# Altium integrated library Weidmueller_OMNIMATE_Power.IntLib: 508 symbols (part 5 of 9) (continued)
## 1157350000 (continued)
OMNIMATE Power - series BU/SU 10.16IT; PartNumber: 1157350000; Manufacturer: Weidmueller; Short_text_for_material: SU 10.16IT/04/270MF4 3.5AG BK BX; Side_termination_characteristic: closed side; Note: Middle flange; Mounting_onto_the_PCB: Solder connection; Pitch_mm: 10.16 mm; Pitch_inch: 0.4 inch; No_of_poles: 4; Outgoing_elbow: 270°; Solder_pin_length_mm: 3.5 mm; Contact_material: Cu-Leg; Contact_surface: silver-plated; Insulating_material: PA GF; UL_94_flammability_rating: V-0; Rated_voltage_for_surge_voltage_class_pollution_degree_II_2: 1000 V; Rated_voltage_use_group_B_UL_1059: 300 V; Rated_current_use_group_B_UL_1059: 54 A; PackageReference: SU_10_16IT_270MF4_04; Colour: Black; Packaging: Box; Qty: 36 PCS; Revision: V1; ComponentLink1Description: Manufacturer URL; ComponentLink1URL: http://www.weidmueller.com/; ComponentLink2Description: URL Link1; ComponentLink2URL: http://catalog.weidmueller.com/catalog/Start.do?localeId=en&ObjectID=1157350000
footprint SU_10_16IT_270MF4_04 (OMNIMATE Power - Serie BU/SU 10.16IT  SU 10.16IT/04/270MF4 3.5)
pins: A1, A2, A3, A4

## 1157350000_Single
designator J?
OMNIMATE Power - series BU/SU 10.16IT; PartNumber: 1157350000; Manufacturer: Weidmueller; Short_text_for_material: SU 10.16IT/04/270MF4 3.5AG BK BX; Side_termination_characteristic: closed side; Note: Middle flange; Mounting_onto_the_PCB: Solder connection; Pitch_mm: 10.16 mm; Pitch_inch: 0.4 inch; No_of_poles: 4; Outgoing_elbow: 270°; Solder_pin_length_mm: 3.5 mm; Contact_material: Cu-Leg; Contact_surface: silver-plated; Insulating_material: PA GF; UL_94_flammability_rating: V-0; Rated_voltage_for_surge_voltage_class_pollution_degree_II_2: 1000 V; Rated_voltage_use_group_B_UL_1059: 300 V; Rated_current_use_group_B_UL_1059: 54 A; PackageReference: SU_10_16IT_270MF4_04; Colour: Black; Packaging: Box; Qty: 36 PCS; Revision: V1; ComponentLink1Description: Manufacturer URL; ComponentLink1URL: http://www.weidmueller.com/; ComponentLink2Description: URL Link1; ComponentLink2URL: http://catalog.weidmueller.com/catalog/Start.do?localeId=en&ObjectID=1157350000
footprint SU_10_16IT_270MF4_04 (OMNIMATE Power - Serie BU/SU 10.16IT  SU 10.16IT/04/270MF4 3.5)
part A pins: A1
part B pins: A2
part C pins: A3
part D pins: A4

## 1157380000
designator J?
OMNIMATE Power - series BV/SV 7.62HP; PartNumber: 1157380000; Manufacturer: Weidmueller; Short_text_for_material: SV 7.62HP/04/90G SC/08R SN BK BX; Side_termination_characteristic: closed side; Mounting_onto_the_PCB: Solder connection; Pitch_mm: 7.62 mm; Pitch_inch: 0.3 inch; No_of_poles: 4; Outgoing_elbow: 90°; Solder_pin_length_mm: 3.5 mm; Contact_material: Cu-Leg; Contact_surface: tinned; Insulating_material: PA GF; UL_94_flammability_rating: V-0; Rated_voltage_for_surge_voltage_class_pollution_degree_II_2: 1000 V; Rated_voltage_use_group_B_UL_1059: 300 V; Rated_current_use_group_B_UL_1059: 35 A; PackageReference: SV_7_62HP_04_SC_3_81_90_08; Colour: Black; Packaging: Box; Qty: 42 PCS; Revision: V1; ComponentLink1Description: Manufacturer URL; ComponentLink1URL: http://www.weidmueller.com/; ComponentLink2Description: URL Link1; ComponentLink2URL: http://catalog.weidmueller.com/catalog/Start.do?localeId=en&ObjectID=1157380000
footprint SV_7_62HP_04_SC_3_81_90_08 (OMNIMATE Power - Serie BV/SV 7.62HP  SV 7.62HP/04/90G SC/08R)
part A pins: P1, P2, P3, P4
part B pins: SA1, SA2, SA3, SA4
part C pins: SB1, SB2, SB3, SB4

## 1157380000_Single
designator J?
OMNIMATE Power - series BV/SV 7.62HP; PartNumber: 1157380000; Manufacturer: Weidmueller; Short_text_for_material: SV 7.62HP/04/90G SC/08R SN BK BX; Side_termination_characteristic: closed side; Mounting_onto_the_PCB: Solder connection; Pitch_mm: 7.62 mm; Pitch_inch: 0.3 inch; No_of_poles: 4; Outgoing_elbow: 90°; Solder_pin_length_mm: 3.5 mm; Contact_material: Cu-Leg; Contact_surface: tinned; Insulating_material: PA GF; UL_94_flammability_rating: V-0; Rated_voltage_for_surge_voltage_class_pollution_degree_II_2: 1000 V; Rated_voltage_use_group_B_UL_1059: 300 V; Rated_current_use_group_B_UL_1059: 35 A; PackageReference: SV_7_62HP_04_SC_3_81_90_08; Colour: Black; Packaging: Box; Qty: 42 PCS; Revision: V1; ComponentLink1Description: Manufacturer URL; ComponentLink1URL: http://www.weidmueller.com/; ComponentLink2Description: URL Link1; ComponentLink2URL: http://catalog.weidmueller.com/catalog/Start.do?localeId=en&ObjectID=1157380000
footprint SV_7_62HP_04_SC_3_81_90_08 (OMNIMATE Power - Serie BV/SV 7.62HP  SV 7.62HP/04/90G SC/08R)
part A pins: P1
part B pins: P2
part C pins: P3
part D pins: P4
part E pins: SA1
part F pins: SA2
part G pins: SA3
part H pins: SA4
part I pins: SB1
part J pins: SB2
part K pins: SB3
part L pins: SB4

## 1173610000
designator J?
OMNIMATE Power - series BL/SL 7.62IT; PartNumber: 1173610000; Manufacturer: Weidmueller; Short_text_for_material: SL 7.62IT/02/90MF2 3.2SN BK BX SO; Side_termination_characteristic: closed side; Note: Middle flange; Mounting_onto_the_PCB: Solder connection; Pitch_mm: 7.62 mm; Pitch_inch: 0.3 inch; No_of_poles: 2; Outgoing_elbow: 90°; Solder_pin_length_mm: 3.2 mm; Contact_material: Cu-Leg; Contact_surface: tinned; Insulating_material: PBT GF; UL_94_flammability_rating: V-0; Rated_voltage_for_surge_voltage_class_pollution_degree_II_2: 630 V; Rated_voltage_use_group_B_UL_1059: 300 V; Rated_current_use_group_B_UL_1059: 20 A; PackageReference: SL_7_62IT_90MF2_02; Colour: Black; Packaging: Box; Qty: 100 PCS; Revision: V1; ComponentLink1Description: Manufacturer URL; ComponentLink1URL: http://www.weidmueller.com/; ComponentLink2Description: URL Link1; ComponentLink2URL: http://catalog.weidmueller.com/catalog/Start.do?localeId=en&ObjectID=1173610000
footprint SL_7_62IT_90MF2_02 (OMNIMATE Power - Serie BL/SL 7.62IT  SL 7.62IT/02/90MF2 3.2)
pins: A1, A2

## 1173610000_Single
designator J?
OMNIMATE Power - series BL/SL 7.62IT; PartNumber: 1173610000; Manufacturer: Weidmueller; Short_text_for_material: SL 7.62IT/02/90MF2 3.2SN BK BX SO; Side_termination_characteristic: closed side; Note: Middle flange; Mounting_onto_the_PCB: Solder connection; Pitch_mm: 7.62 mm; Pitch_inch: 0.3 inch; No_of_poles: 2; Outgoing_elbow: 90°; Solder_pin_length_mm: 3.2 mm; Contact_material: Cu-Leg; Contact_surface: tinned; Insulating_material: PBT GF; UL_94_flammability_rating: V-0; Rated_voltage_for_surge_voltage_class_pollution_degree_II_2: 630 V; Rated_voltage_use_group_B_UL_1059: 300 V; Rated_current_use_group_B_UL_1059: 20 A; PackageReference: SL_7_62IT_90MF2_02; Colour: Black; Packaging: Box; Qty: 100 PCS; Revision: V1; ComponentLink1Description: Manufacturer URL; ComponentLink1URL: http://www.weidmueller.com/; ComponentLink2Description: URL Link1; ComponentLink2URL: http://catalog.weidmueller.com/catalog/Start.do?localeId=en&ObjectID=1173610000
footprint SL_7_62IT_90MF2_02 (OMNIMATE Power - Serie BL/SL 7.62IT  SL 7.62IT/02/90MF2 3.2)
part A pins: A1
part B pins: A2

## 1173640000
designator J?
OMNIMATE Power - series BL/SL 7.62IT; PartNumber: 1173640000; Manufacturer: Weidmueller; Short_text_for_material: SL 7.62IT/03/90MF2 3.2SN BK BX; Side_termination_characteristic: closed side; Note: Middle flange; Mounting_onto_the_PCB: Solder connection; Pitch_mm: 7.62 mm; Pitch_inch: 0.3 inch; No_of_poles: 3; Outgoing_elbow: 90°; Solder_pin_length_mm: 3.2 mm; Contact_material: Cu-Leg; Contact_surface: tinned; Insulating_material: PBT GF; UL_94_flammability_rating: V-0; Rated_voltage_for_surge_voltage_class_pollution_degree_II_2: 630 V; Rated_voltage_use_group_B_UL_1059: 300 V; Rated_current_use_group_B_UL_1059: 20 A; PackageReference: SL_7_62IT_90MF2_03; Colour: Black; Packaging: Box; Qty: 100 PCS; Revision: V1; ComponentLink1Description: Manufacturer URL; ComponentLink1URL: http://www.weidmueller.com/; ComponentLink2Description: URL Link1; ComponentLink2URL: http://catalog.weidmueller.com/catalog/Start.do?localeId=en&ObjectID=1173640000
footprint SL_7_62IT_90MF2_03 (OMNIMATE Power - Serie BL/SL 7.62IT  SL 7.62IT/02/90MF3 3.2)
pins: A1, A2, A3

## 1173640000_Single
designator J?
OMNIMATE Power - series BL/SL 7.62IT; PartNumber: 1173640000; Manufacturer: Weidmueller; Short_text_for_material: SL 7.62IT/03/90MF2 3.2SN BK BX; Side_termination_characteristic: closed side; Note: Middle flange; Mounting_onto_the_PCB: Solder connection; Pitch_mm: 7.62 mm; Pitch_inch: 0.3 inch; No_of_poles: 3; Outgoing_elbow: 90°; Solder_pin_length_mm: 3.2 mm; Contact_material: Cu-Leg; Contact_surface: tinned; Insulating_material: PBT GF; UL_94_flammability_rating: V-0; Rated_voltage_for_surge_voltage_class_pollution_degree_II_2: 630 V; Rated_voltage_use_group_B_UL_1059: 300 V; Rated_current_use_group_B_UL_1059: 20 A; PackageReference: SL_7_62IT_90MF2_03; Colour: Black; Packaging: Box; Qty: 100 PCS; Revision: V1; ComponentLink1Description: Manufacturer URL; ComponentLink1URL: http://www.weidmueller.com/; ComponentLink2Description: URL Link1; ComponentLink2URL: http://catalog.weidmueller.com/catalog/Start.do?localeId=en&ObjectID=1173640000
footprint SL_7_62IT_90MF2_03 (OMNIMATE Power - Serie BL/SL 7.62IT  SL 7.62IT/02/90MF3 3.2)
part A pins: A1
part B pins: A2
part C pins: A3

## 1173690000
designator J?
OMNIMATE Power - series BL/SL 7.62IT; PartNumber: 1173690000; Manufacturer: Weidmueller; Short_text_for_material: SL 7.62IT/03/90MF3 3.2SN BK BX; Side_termination_characteristic: closed side; Note: Middle flange; Mounting_onto_the_PCB: Solder connection; Pitch_mm: 7.62 mm; Pitch_inch: 0.3 inch; No_of_poles: 3; Outgoing_elbow: 90°; Solder_pin_length_mm: 3.2 mm; Contact_material: Cu-Leg; Contact_surface: tinned; Insulating_material: PBT GF; UL_94_flammability_rating: V-0; Rated_voltage_for_surge_voltage_class_pollution_degree_II_2: 630 V; Rated_voltage_use_group_B_UL_1059: 300 V; Rated_current_use_group_B_UL_1059: 20 A; PackageReference: SL_7_62IT_90MF3_03; Colour: Black; Packaging: Box; Qty: 100 PCS; Revision: V1; ComponentLink1Description: Manufacturer URL; ComponentLink1URL: http://www.weidmueller.com/; ComponentLink2Description: URL Link1; ComponentLink2URL: http://catalog.weidmueller.com/catalog/Start.do?localeId=en&ObjectID=1173690000
footprint SL_7_62IT_90MF3_03 (OMNIMATE Power - Serie BL/SL 7.62IT  SL 7.62IT/03/90MF3 3.2)
pins: A1, A2, A3

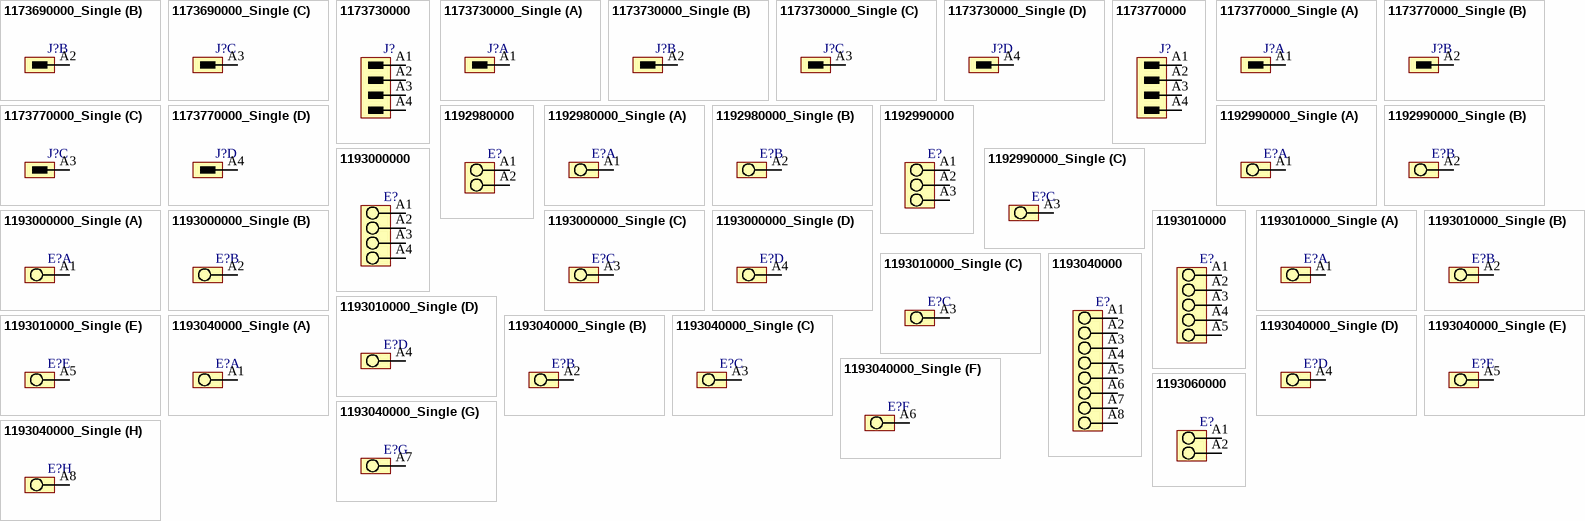
[diagram p18: symbols 1173690000_Single to 1193060000]

## 1173690000_Single
designator J?
OMNIMATE Power - series BL/SL 7.62IT; PartNumber: 1173690000; Manufacturer: Weidmueller; Short_text_for_material: SL 7.62IT/03/90MF3 3.2SN BK BX; Side_termination_characteristic: closed side; Note: Middle flange; Mounting_onto_the_PCB: Solder connection; Pitch_mm: 7.62 mm; Pitch_inch: 0.3 inch; No_of_poles: 3; Outgoing_elbow: 90°; Solder_pin_length_mm: 3.2 mm; Contact_material: Cu-Leg; Contact_surface: tinned; Insulating_material: PBT GF; UL_94_flammability_rating: V-0; Rated_voltage_for_surge_voltage_class_pollution_degree_II_2: 630 V; Rated_voltage_use_group_B_UL_1059: 300 V; Rated_current_use_group_B_UL_1059: 20 A; PackageReference: SL_7_62IT_90MF3_03; Colour: Black; Packaging: Box; Qty: 100 PCS; Revision: V1; ComponentLink1Description: Manufacturer URL; ComponentLink1URL: http://www.weidmueller.com/; ComponentLink2Description: URL Link1; ComponentLink2URL: http://catalog.weidmueller.com/catalog/Start.do?localeId=en&ObjectID=1173690000
footprint SL_7_62IT_90MF3_03 (OMNIMATE Power - Serie BL/SL 7.62IT  SL 7.62IT/03/90MF3 3.2)
part A pins: A1
part B pins: A2
part C pins: A3

## 1173730000
designator J?
OMNIMATE Power - series BL/SL 7.62IT; PartNumber: 1173730000; Manufacturer: Weidmueller; Short_text_for_material: SL 7.62IT/04/90MF2 3.2SN BK BX; Side_termination_characteristic: closed side; Note: Middle flange; Mounting_onto_the_PCB: Solder connection; Pitch_mm: 7.62 mm; Pitch_inch: 0.3 inch; No_of_poles: 4; Outgoing_elbow: 90°; Solder_pin_length_mm: 3.2 mm; Contact_material: Cu-Leg; Contact_surface: tinned; Insulating_material: PBT GF; UL_94_flammability_rating: V-0; Rated_voltage_for_surge_voltage_class_pollution_degree_II_2: 630 V; Rated_voltage_use_group_B_UL_1059: 300 V; Rated_current_use_group_B_UL_1059: 20 A; PackageReference: SL_7_62IT_90MF2_04; Colour: Black; Packaging: Box; Qty: 100 PCS; Revision: V1; ComponentLink1Description: Manufacturer URL; ComponentLink1URL: http://www.weidmueller.com/; ComponentLink2Description: URL Link1; ComponentLink2URL: http://catalog.weidmueller.com/catalog/Start.do?localeId=en&ObjectID=1173730000
footprint SL_7_62IT_90MF2_04 (OMNIMATE Power - Serie BL/SL 7.62IT  SL 7.62IT/02/90MF4 3.2)
pins: A1, A2, A3, A4

## 1173730000_Single
designator J?
OMNIMATE Power - series BL/SL 7.62IT; PartNumber: 1173730000; Manufacturer: Weidmueller; Short_text_for_material: SL 7.62IT/04/90MF2 3.2SN BK BX; Side_termination_characteristic: closed side; Note: Middle flange; Mounting_onto_the_PCB: Solder connection; Pitch_mm: 7.62 mm; Pitch_inch: 0.3 inch; No_of_poles: 4; Outgoing_elbow: 90°; Solder_pin_length_mm: 3.2 mm; Contact_material: Cu-Leg; Contact_surface: tinned; Insulating_material: PBT GF; UL_94_flammability_rating: V-0; Rated_voltage_for_surge_voltage_class_pollution_degree_II_2: 630 V; Rated_voltage_use_group_B_UL_1059: 300 V; Rated_current_use_group_B_UL_1059: 20 A; PackageReference: SL_7_62IT_90MF2_04; Colour: Black; Packaging: Box; Qty: 100 PCS; Revision: V1; ComponentLink1Description: Manufacturer URL; ComponentLink1URL: http://www.weidmueller.com/; ComponentLink2Description: URL Link1; ComponentLink2URL: http://catalog.weidmueller.com/catalog/Start.do?localeId=en&ObjectID=1173730000
footprint SL_7_62IT_90MF2_04 (OMNIMATE Power - Serie BL/SL 7.62IT  SL 7.62IT/02/90MF4 3.2)
part A pins: A1
part B pins: A2
part C pins: A3
part D pins: A4

## 1173770000
designator J?
OMNIMATE Power - series BL/SL 7.62IT; PartNumber: 1173770000; Manufacturer: Weidmueller; Short_text_for_material: SL 7.62IT/04/90MF4 3.2SN BK BX; Side_termination_characteristic: closed side; Note: Middle flange; Mounting_onto_the_PCB: Solder connection; Pitch_mm: 7.62 mm; Pitch_inch: 0.3 inch; No_of_poles: 4; Outgoing_elbow: 90°; Solder_pin_length_mm: 3.2 mm; Contact_material: Cu-Leg; Contact_surface: tinned; Insulating_material: PBT GF; UL_94_flammability_rating: V-0; Rated_voltage_for_surge_voltage_class_pollution_degree_II_2: 630 V; Rated_voltage_use_group_B_UL_1059: 300 V; Rated_current_use_group_B_UL_1059: 20 A; PackageReference: SL_7_62IT_90MF4_04; Colour: Black; Packaging: Box; Qty: 100 PCS; Revision: V1; ComponentLink1Description: Manufacturer URL; ComponentLink1URL: http://www.weidmueller.com/; ComponentLink2Description: URL Link1; ComponentLink2URL: http://catalog.weidmueller.com/catalog/Start.do?localeId=en&ObjectID=1173770000
footprint SL_7_62IT_90MF4_04 (OMNIMATE Power - Serie BL/SL 7.62IT  SL 7.62IT/04/90MF4 3.2)
pins: A1, A2, A3, A4

## 1173770000_Single
designator J?
OMNIMATE Power - series BL/SL 7.62IT; PartNumber: 1173770000; Manufacturer: Weidmueller; Short_text_for_material: SL 7.62IT/04/90MF4 3.2SN BK BX; Side_termination_characteristic: closed side; Note: Middle flange; Mounting_onto_the_PCB: Solder connection; Pitch_mm: 7.62 mm; Pitch_inch: 0.3 inch; No_of_poles: 4; Outgoing_elbow: 90°; Solder_pin_length_mm: 3.2 mm; Contact_material: Cu-Leg; Contact_surface: tinned; Insulating_material: PBT GF; UL_94_flammability_rating: V-0; Rated_voltage_for_surge_voltage_class_pollution_degree_II_2: 630 V; Rated_voltage_use_group_B_UL_1059: 300 V; Rated_current_use_group_B_UL_1059: 20 A; PackageReference: SL_7_62IT_90MF4_04; Colour: Black; Packaging: Box; Qty: 100 PCS; Revision: V1; ComponentLink1Description: Manufacturer URL; ComponentLink1URL: http://www.weidmueller.com/; ComponentLink2Description: URL Link1; ComponentLink2URL: http://catalog.weidmueller.com/catalog/Start.do?localeId=en&ObjectID=1173770000
footprint SL_7_62IT_90MF4_04 (OMNIMATE Power - Serie BL/SL 7.62IT  SL 7.62IT/04/90MF4 3.2)
part A pins: A1
part B pins: A2
part C pins: A3
part D pins: A4

## 1192980000
designator E?
OMNIMATE Power - series LUP; PartNumber: 1192980000; Manufacturer: Weidmueller; Short_text_for_material: LUP 10.16/02/90V 3.2SN BK BX; Side_termination_characteristic: closed side; Mounting_onto_the_PCB: Solder connection; Pitch_mm: 10,16 mm; Pitch_inch: 0,4 inch; No_of_poles: 2; Solder_pin_length_mm: 3,2 mm; Contact_material: E-Cu; Contact_surface: tinned; Insulating_material: Wemid (PA); UL_94_flammability_rating: V-0; Rated_voltage_for_surge_voltage_class_pollution_degree_II_2: 1000 V; Solid_min_H05_07_V_U: 0,5 mm²; Solid_max_H05_07_V_U: 16 mm²; Rated_voltage_use_group_B_UL_1059: 600 V; Rated_current_use_group_B_UL_1059: 51 A; Wire_cross_section_AWG_min_UL_1059: AWG 22; Wire_cross_section_AWG_max_UL_1059: AWG 6; PackageReference: LUP_10_16_90V_02; Colour: Black; Packaging: Box; Qty: 20 PCS; Revision: V1; ComponentLink1Description: Manufacturer URL; ComponentLink1URL: http://www.weidmueller.com/; ComponentLink2Description: URL Link1; ComponentLink2URL: http://catalog.weidmueller.com/catalog/Start.do?localeId=en&ObjectID=1192980000
footprint LUP_10_16_90V_02 (OMNIMATE Power - Serie LUP  LUP 10.16/02/90V 3.2)
pins: A1, A2
1 alternate drawing of the same symbol

## 1192980000_Single
designator E?
OMNIMATE Power - series LUP; PartNumber: 1192980000; Manufacturer: Weidmueller; Short_text_for_material: LUP 10.16/02/90V 3.2SN BK BX; Side_termination_characteristic: closed side; Mounting_onto_the_PCB: Solder connection; Pitch_mm: 10,16 mm; Pitch_inch: 0,4 inch; No_of_poles: 2; Solder_pin_length_mm: 3,2 mm; Contact_material: E-Cu; Contact_surface: tinned; Insulating_material: Wemid (PA); UL_94_flammability_rating: V-0; Rated_voltage_for_surge_voltage_class_pollution_degree_II_2: 1000 V; Solid_min_H05_07_V_U: 0,5 mm²; Solid_max_H05_07_V_U: 16 mm²; Rated_voltage_use_group_B_UL_1059: 600 V; Rated_current_use_group_B_UL_1059: 51 A; Wire_cross_section_AWG_min_UL_1059: AWG 22; Wire_cross_section_AWG_max_UL_1059: AWG 6; PackageReference: LUP_10_16_90V_02; Colour: Black; Packaging: Box; Qty: 20 PCS; Revision: V1; ComponentLink1Description: Manufacturer URL; ComponentLink1URL: http://www.weidmueller.com/; ComponentLink2Description: URL Link1; ComponentLink2URL: http://catalog.weidmueller.com/catalog/Start.do?localeId=en&ObjectID=1192980000
footprint LUP_10_16_90V_02 (OMNIMATE Power - Serie LUP  LUP 10.16/02/90V 3.2)
part A pins: A1
part B pins: A2
1 alternate drawing of the same symbol

## 1192990000
designator E?
OMNIMATE Power - series LUP; PartNumber: 1192990000; Manufacturer: Weidmueller; Short_text_for_material: LUP 10.16/03/90V 3.2SN BK BX; Side_termination_characteristic: closed side; Mounting_onto_the_PCB: Solder connection; Pitch_mm: 10,16 mm; Pitch_inch: 0,4 inch; No_of_poles: 3; Solder_pin_length_mm: 3,2 mm; Contact_material: E-Cu; Contact_surface: tinned; Insulating_material: Wemid (PA); UL_94_flammability_rating: V-0; Rated_voltage_for_surge_voltage_class_pollution_degree_II_2: 1000 V; Solid_min_H05_07_V_U: 0,5 mm²; Solid_max_H05_07_V_U: 16 mm²; Rated_voltage_use_group_B_UL_1059: 600 V; Rated_current_use_group_B_UL_1059: 51 A; Wire_cross_section_AWG_min_UL_1059: AWG 22; Wire_cross_section_AWG_max_UL_1059: AWG 6; PackageReference: LUP_10_16_90V_03; Colour: Black; Packaging: Box; Qty: 20 PCS; Revision: V1; ComponentLink1Description: Manufacturer URL; ComponentLink1URL: http://www.weidmueller.com/; ComponentLink2Description: URL Link1; ComponentLink2URL: http://catalog.weidmueller.com/catalog/Start.do?localeId=en&ObjectID=1192990000
footprint LUP_10_16_90V_03 (OMNIMATE Power - Serie LUP  LUP 10.16/03/90V 3.2)
pins: A1, A2, A3
1 alternate drawing of the same symbol

## 1192990000_Single
designator E?
OMNIMATE Power - series LUP; PartNumber: 1192990000; Manufacturer: Weidmueller; Short_text_for_material: LUP 10.16/03/90V 3.2SN BK BX; Side_termination_characteristic: closed side; Mounting_onto_the_PCB: Solder connection; Pitch_mm: 10,16 mm; Pitch_inch: 0,4 inch; No_of_poles: 3; Solder_pin_length_mm: 3,2 mm; Contact_material: E-Cu; Contact_surface: tinned; Insulating_material: Wemid (PA); UL_94_flammability_rating: V-0; Rated_voltage_for_surge_voltage_class_pollution_degree_II_2: 1000 V; Solid_min_H05_07_V_U: 0,5 mm²; Solid_max_H05_07_V_U: 16 mm²; Rated_voltage_use_group_B_UL_1059: 600 V; Rated_current_use_group_B_UL_1059: 51 A; Wire_cross_section_AWG_min_UL_1059: AWG 22; Wire_cross_section_AWG_max_UL_1059: AWG 6; PackageReference: LUP_10_16_90V_03; Colour: Black; Packaging: Box; Qty: 20 PCS; Revision: V1; ComponentLink1Description: Manufacturer URL; ComponentLink1URL: http://www.weidmueller.com/; ComponentLink2Description: URL Link1; ComponentLink2URL: http://catalog.weidmueller.com/catalog/Start.do?localeId=en&ObjectID=1192990000
footprint LUP_10_16_90V_03 (OMNIMATE Power - Serie LUP  LUP 10.16/03/90V 3.2)
part A pins: A1
part B pins: A2
part C pins: A3
1 alternate drawing of the same symbol

## 1193000000
designator E?
OMNIMATE Power - series LUP; PartNumber: 1193000000; Manufacturer: Weidmueller; Short_text_for_material: LUP 10.16/04/90V 3.2SN BK BX; Side_termination_characteristic: closed side; Mounting_onto_the_PCB: Solder connection; Pitch_mm: 10,16 mm; Pitch_inch: 0,4 inch; No_of_poles: 4; Solder_pin_length_mm: 3,2 mm; Contact_material: E-Cu; Contact_surface: tinned; Insulating_material: Wemid (PA); UL_94_flammability_rating: V-0; Rated_voltage_for_surge_voltage_class_pollution_degree_II_2: 1000 V; Solid_min_H05_07_V_U: 0,5 mm²; Solid_max_H05_07_V_U: 16 mm²; Rated_voltage_use_group_B_UL_1059: 600 V; Rated_current_use_group_B_UL_1059: 51 A; Wire_cross_section_AWG_min_UL_1059: AWG 22; Wire_cross_section_AWG_max_UL_1059: AWG 6; PackageReference: LUP_10_16_90V_04; Colour: Black; Packaging: Box; Qty: 20 PCS; Revision: V1; ComponentLink1Description: Manufacturer URL; ComponentLink1URL: http://www.weidmueller.com/; ComponentLink2Description: URL Link1; ComponentLink2URL: http://catalog.weidmueller.com/catalog/Start.do?localeId=en&ObjectID=1193000000
footprint LUP_10_16_90V_04 (OMNIMATE Power - Serie LUP  LUP 10.16/04/90V 3.2)
pins: A1, A2, A3, A4
1 alternate drawing of the same symbol

## 1193000000_Single
designator E?
OMNIMATE Power - series LUP; PartNumber: 1193000000; Manufacturer: Weidmueller; Short_text_for_material: LUP 10.16/04/90V 3.2SN BK BX; Side_termination_characteristic: closed side; Mounting_onto_the_PCB: Solder connection; Pitch_mm: 10,16 mm; Pitch_inch: 0,4 inch; No_of_poles: 4; Solder_pin_length_mm: 3,2 mm; Contact_material: E-Cu; Contact_surface: tinned; Insulating_material: Wemid (PA); UL_94_flammability_rating: V-0; Rated_voltage_for_surge_voltage_class_pollution_degree_II_2: 1000 V; Solid_min_H05_07_V_U: 0,5 mm²; Solid_max_H05_07_V_U: 16 mm²; Rated_voltage_use_group_B_UL_1059: 600 V; Rated_current_use_group_B_UL_1059: 51 A; Wire_cross_section_AWG_min_UL_1059: AWG 22; Wire_cross_section_AWG_max_UL_1059: AWG 6; PackageReference: LUP_10_16_90V_04; Colour: Black; Packaging: Box; Qty: 20 PCS; Revision: V1; ComponentLink1Description: Manufacturer URL; ComponentLink1URL: http://www.weidmueller.com/; ComponentLink2Description: URL Link1; ComponentLink2URL: http://catalog.weidmueller.com/catalog/Start.do?localeId=en&ObjectID=1193000000
footprint LUP_10_16_90V_04 (OMNIMATE Power - Serie LUP  LUP 10.16/04/90V 3.2)
part A pins: A1
part B pins: A2
part C pins: A3
part D pins: A4
1 alternate drawing of the same symbol

## 1193010000
designator E?
OMNIMATE Power - series LUP; PartNumber: 1193010000; Manufacturer: Weidmueller; Short_text_for_material: LUP 10.16/05/90V 3.2SN BK BX; Side_termination_characteristic: closed side; Mounting_onto_the_PCB: Solder connection; Pitch_mm: 10,16 mm; Pitch_inch: 0,4 inch; No_of_poles: 5; Solder_pin_length_mm: 3,2 mm; Contact_material: E-Cu; Contact_surface: tinned; Insulating_material: Wemid (PA); UL_94_flammability_rating: V-0; Rated_voltage_for_surge_voltage_class_pollution_degree_II_2: 1000 V; Solid_min_H05_07_V_U: 0,5 mm²; Solid_max_H05_07_V_U: 16 mm²; Rated_voltage_use_group_B_UL_1059: 600 V; Rated_current_use_group_B_UL_1059: 51 A; Wire_cross_section_AWG_min_UL_1059: AWG 22; Wire_cross_section_AWG_max_UL_1059: AWG 6; PackageReference: LUP_10_16_90V_05; Colour: Black; Packaging: Box; Qty: 20 PCS; Revision: V1; ComponentLink1Description: Manufacturer URL; ComponentLink1URL: http://www.weidmueller.com/; ComponentLink2Description: URL Link1; ComponentLink2URL: http://catalog.weidmueller.com/catalog/Start.do?localeId=en&ObjectID=1193010000
footprint LUP_10_16_90V_05 (OMNIMATE Power - Serie LUP  LUP 10.16/05/90V 3.2)
pins: A1, A2, A3, A4, A5
1 alternate drawing of the same symbol

## 1193010000_Single
designator E?
OMNIMATE Power - series LUP; PartNumber: 1193010000; Manufacturer: Weidmueller; Short_text_for_material: LUP 10.16/05/90V 3.2SN BK BX; Side_termination_characteristic: closed side; Mounting_onto_the_PCB: Solder connection; Pitch_mm: 10,16 mm; Pitch_inch: 0,4 inch; No_of_poles: 5; Solder_pin_length_mm: 3,2 mm; Contact_material: E-Cu; Contact_surface: tinned; Insulating_material: Wemid (PA); UL_94_flammability_rating: V-0; Rated_voltage_for_surge_voltage_class_pollution_degree_II_2: 1000 V; Solid_min_H05_07_V_U: 0,5 mm²; Solid_max_H05_07_V_U: 16 mm²; Rated_voltage_use_group_B_UL_1059: 600 V; Rated_current_use_group_B_UL_1059: 51 A; Wire_cross_section_AWG_min_UL_1059: AWG 22; Wire_cross_section_AWG_max_UL_1059: AWG 6; PackageReference: LUP_10_16_90V_05; Colour: Black; Packaging: Box; Qty: 20 PCS; Revision: V1; ComponentLink1Description: Manufacturer URL; ComponentLink1URL: http://www.weidmueller.com/; ComponentLink2Description: URL Link1; ComponentLink2URL: http://catalog.weidmueller.com/catalog/Start.do?localeId=en&ObjectID=1193010000
footprint LUP_10_16_90V_05 (OMNIMATE Power - Serie LUP  LUP 10.16/05/90V 3.2)
part A pins: A1
part B pins: A2
part C pins: A3
part D pins: A4
part E pins: A5
1 alternate drawing of the same symbol

## 1193040000
designator E?
OMNIMATE Power - series LUP; PartNumber: 1193040000; Manufacturer: Weidmueller; Short_text_for_material: LUP 10.16/08/90V 3.2SN BK BX; Side_termination_characteristic: closed side; Mounting_onto_the_PCB: Solder connection; Pitch_mm: 10,16 mm; Pitch_inch: 0,4 inch; No_of_poles: 8; Solder_pin_length_mm: 3,2 mm; Contact_material: E-Cu; Contact_surface: tinned; Insulating_material: Wemid (PA); UL_94_flammability_rating: V-0; Rated_voltage_for_surge_voltage_class_pollution_degree_II_2: 1000 V; Solid_min_H05_07_V_U: 0,5 mm²; Solid_max_H05_07_V_U: 16 mm²; Rated_voltage_use_group_B_UL_1059: 600 V; Rated_current_use_group_B_UL_1059: 51 A; Wire_cross_section_AWG_min_UL_1059: AWG 22; Wire_cross_section_AWG_max_UL_1059: AWG 6; PackageReference: LUP_10_16_90V_08; Colour: Black; Packaging: Box; Qty: 20 PCS; Revision: V1; ComponentLink1Description: Manufacturer URL; ComponentLink1URL: http://www.weidmueller.com/; ComponentLink2Description: URL Link1; ComponentLink2URL: http://catalog.weidmueller.com/catalog/Start.do?localeId=en&ObjectID=1193040000
footprint LUP_10_16_90V_08 (OMNIMATE Power - Serie LUP  LUP 10.16/08/90V 3.2)
pins: A1, A2, A3, A4, A5, A6, A7, A8
1 alternate drawing of the same symbol

## 1193040000_Single
designator E?
OMNIMATE Power - series LUP; PartNumber: 1193040000; Manufacturer: Weidmueller; Short_text_for_material: LUP 10.16/08/90V 3.2SN BK BX; Side_termination_characteristic: closed side; Mounting_onto_the_PCB: Solder connection; Pitch_mm: 10,16 mm; Pitch_inch: 0,4 inch; No_of_poles: 8; Solder_pin_length_mm: 3,2 mm; Contact_material: E-Cu; Contact_surface: tinned; Insulating_material: Wemid (PA); UL_94_flammability_rating: V-0; Rated_voltage_for_surge_voltage_class_pollution_degree_II_2: 1000 V; Solid_min_H05_07_V_U: 0,5 mm²; Solid_max_H05_07_V_U: 16 mm²; Rated_voltage_use_group_B_UL_1059: 600 V; Rated_current_use_group_B_UL_1059: 51 A; Wire_cross_section_AWG_min_UL_1059: AWG 22; Wire_cross_section_AWG_max_UL_1059: AWG 6; PackageReference: LUP_10_16_90V_08; Colour: Black; Packaging: Box; Qty: 20 PCS; Revision: V1; ComponentLink1Description: Manufacturer URL; ComponentLink1URL: http://www.weidmueller.com/; ComponentLink2Description: URL Link1; ComponentLink2URL: http://catalog.weidmueller.com/catalog/Start.do?localeId=en&ObjectID=1193040000
footprint LUP_10_16_90V_08 (OMNIMATE Power - Serie LUP  LUP 10.16/08/90V 3.2)
part A pins: A1
part B pins: A2
part C pins: A3
part D pins: A4
part E pins: A5
part F pins: A6
part G pins: A7
part H pins: A8
1 alternate drawing of the same symbol

## 1193060000
designator E?
OMNIMATE Power - series LUP; PartNumber: 1193060000; Manufacturer: Weidmueller; Short_text_for_material: LUP 10.16/02/90V 3.2SN GY BX; Side_termination_characteristic: closed side; Mounting_onto_the_PCB: Solder connection; Pitch_mm: 10,16 mm; Pitch_inch: 0,4 inch; No_of_poles: 2; Solder_pin_length_mm: 3,2 mm; Contact_material: E-Cu; Contact_surface: tinned; Insulating_material: Wemid (PA); UL_94_flammability_rating: V-0; Rated_voltage_for_surge_voltage_class_pollution_degree_II_2: 1000 V; Rated_current_min_no_of_poles_TU_20_deg_C: 76 A; Solid_min_H05_07_V_U: 0,5 mm²; Solid_max_H05_07_V_U: 16 mm²; Rated_voltage_use_group_B_UL_1059: 600 V; Rated_current_use_group_B_UL_1059: 51 A; Wire_cross_section_AWG_min_UL_1059: AWG 22; Wire_cross_section_AWG_max_UL_1059: AWG 6; PackageReference: LUP_10_16_90V_02; Colour: Pebble grey; Packaging: Box; Qty: 20 PCS; Revision: V1; ComponentLink1Description: Manufacturer URL; ComponentLink1URL: http://www.weidmueller.com/; ComponentLink2Description: URL Link1; ComponentLink2URL: http://catalog.weidmueller.com/catalog/Start.do?localeId=en&ObjectID=1193060000
footprint LUP_10_16_90V_02 (OMNIMATE Power - Serie LUP  LUP 10.16/02/90V 3.2)
pins: A1, A2
1 alternate drawing of the same symbol

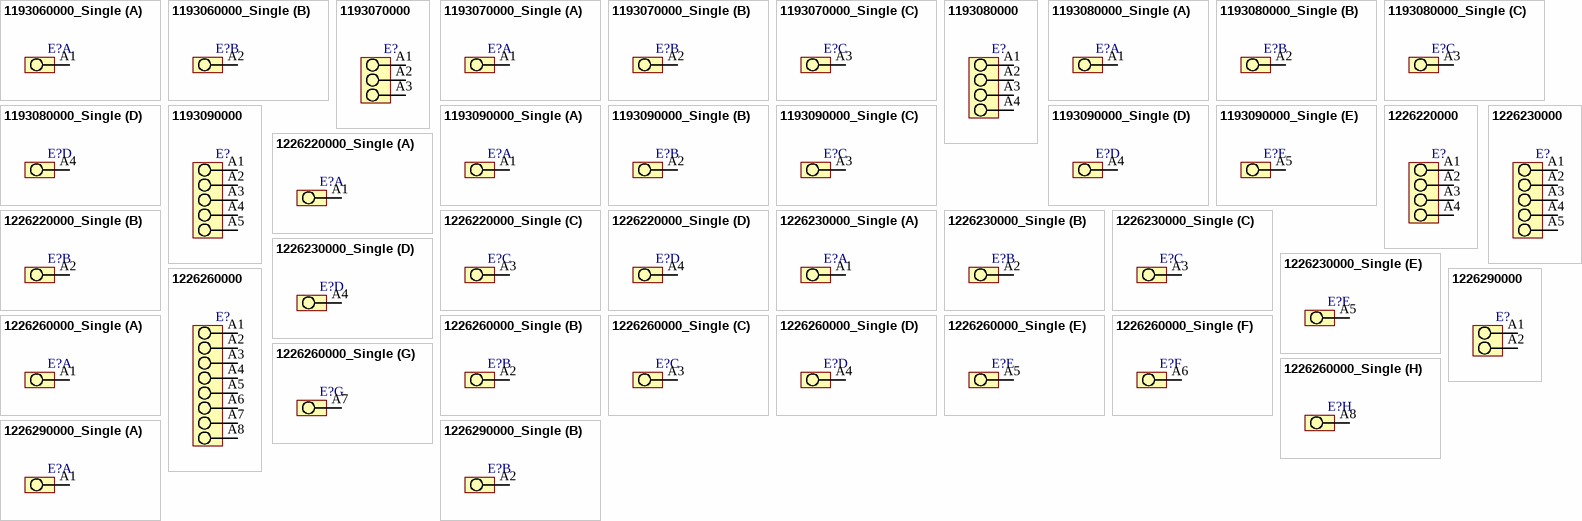
[diagram p19: symbols 1193060000_Single to 1226290000_Single]

## 1193060000_Single
designator E?
OMNIMATE Power - series LUP; PartNumber: 1193060000; Manufacturer: Weidmueller; Short_text_for_material: LUP 10.16/02/90V 3.2SN GY BX; Side_termination_characteristic: closed side; Mounting_onto_the_PCB: Solder connection; Pitch_mm: 10,16 mm; Pitch_inch: 0,4 inch; No_of_poles: 2; Solder_pin_length_mm: 3,2 mm; Contact_material: E-Cu; Contact_surface: tinned; Insulating_material: Wemid (PA); UL_94_flammability_rating: V-0; Rated_voltage_for_surge_voltage_class_pollution_degree_II_2: 1000 V; Rated_current_min_no_of_poles_TU_20_deg_C: 76 A; Solid_min_H05_07_V_U: 0,5 mm²; Solid_max_H05_07_V_U: 16 mm²; Rated_voltage_use_group_B_UL_1059: 600 V; Rated_current_use_group_B_UL_1059: 51 A; Wire_cross_section_AWG_min_UL_1059: AWG 22; Wire_cross_section_AWG_max_UL_1059: AWG 6; PackageReference: LUP_10_16_90V_02; Colour: Pebble grey; Packaging: Box; Qty: 20 PCS; Revision: V1; ComponentLink1Description: Manufacturer URL; ComponentLink1URL: http://www.weidmueller.com/; ComponentLink2Description: URL Link1; ComponentLink2URL: http://catalog.weidmueller.com/catalog/Start.do?localeId=en&ObjectID=1193060000
footprint LUP_10_16_90V_02 (OMNIMATE Power - Serie LUP  LUP 10.16/02/90V 3.2)
part A pins: A1
part B pins: A2
1 alternate drawing of the same symbol

## 1193070000
designator E?
OMNIMATE Power - series LUP; PartNumber: 1193070000; Manufacturer: Weidmueller; Short_text_for_material: LUP 10.16/03/90V 3.2SN GY BX; Side_termination_characteristic: closed side; Mounting_onto_the_PCB: Solder connection; Pitch_mm: 10,16 mm; Pitch_inch: 0,4 inch; No_of_poles: 3; Solder_pin_length_mm: 3,2 mm; Contact_material: E-Cu; Contact_surface: tinned; Insulating_material: Wemid (PA); UL_94_flammability_rating: V-0; Rated_voltage_for_surge_voltage_class_pollution_degree_II_2: 1000 V; Rated_current_min_no_of_poles_TU_20_deg_C: 76 A; Solid_min_H05_07_V_U: 0,5 mm²; Solid_max_H05_07_V_U: 16 mm²; Rated_voltage_use_group_B_UL_1059: 600 V; Rated_current_use_group_B_UL_1059: 51 A; Wire_cross_section_AWG_min_UL_1059: AWG 22; Wire_cross_section_AWG_max_UL_1059: AWG 6; PackageReference: LUP_10_16_90V_03; Colour: Pebble grey; Packaging: Box; Qty: 20 PCS; Revision: V1; ComponentLink1Description: Manufacturer URL; ComponentLink1URL: http://www.weidmueller.com/; ComponentLink2Description: URL Link1; ComponentLink2URL: http://catalog.weidmueller.com/catalog/Start.do?localeId=en&ObjectID=1193070000
footprint LUP_10_16_90V_03 (OMNIMATE Power - Serie LUP  LUP 10.16/03/90V 3.2)
pins: A1, A2, A3
1 alternate drawing of the same symbol

## 1193070000_Single
designator E?
OMNIMATE Power - series LUP; PartNumber: 1193070000; Manufacturer: Weidmueller; Short_text_for_material: LUP 10.16/03/90V 3.2SN GY BX; Side_termination_characteristic: closed side; Mounting_onto_the_PCB: Solder connection; Pitch_mm: 10,16 mm; Pitch_inch: 0,4 inch; No_of_poles: 3; Solder_pin_length_mm: 3,2 mm; Contact_material: E-Cu; Contact_surface: tinned; Insulating_material: Wemid (PA); UL_94_flammability_rating: V-0; Rated_voltage_for_surge_voltage_class_pollution_degree_II_2: 1000 V; Rated_current_min_no_of_poles_TU_20_deg_C: 76 A; Solid_min_H05_07_V_U: 0,5 mm²; Solid_max_H05_07_V_U: 16 mm²; Rated_voltage_use_group_B_UL_1059: 600 V; Rated_current_use_group_B_UL_1059: 51 A; Wire_cross_section_AWG_min_UL_1059: AWG 22; Wire_cross_section_AWG_max_UL_1059: AWG 6; PackageReference: LUP_10_16_90V_03; Colour: Pebble grey; Packaging: Box; Qty: 20 PCS; Revision: V1; ComponentLink1Description: Manufacturer URL; ComponentLink1URL: http://www.weidmueller.com/; ComponentLink2Description: URL Link1; ComponentLink2URL: http://catalog.weidmueller.com/catalog/Start.do?localeId=en&ObjectID=1193070000
footprint LUP_10_16_90V_03 (OMNIMATE Power - Serie LUP  LUP 10.16/03/90V 3.2)
part A pins: A1
part B pins: A2
part C pins: A3
1 alternate drawing of the same symbol

## 1193080000
designator E?
OMNIMATE Power - series LUP; PartNumber: 1193080000; Manufacturer: Weidmueller; Short_text_for_material: LUP 10.16/04/90V 3.2SN GY BX; Side_termination_characteristic: closed side; Mounting_onto_the_PCB: Solder connection; Pitch_mm: 10,16 mm; Pitch_inch: 0,4 inch; No_of_poles: 4; Solder_pin_length_mm: 3,2 mm; Contact_material: E-Cu; Contact_surface: tinned; Insulating_material: Wemid (PA); UL_94_flammability_rating: V-0; Rated_voltage_for_surge_voltage_class_pollution_degree_II_2: 1000 V; Rated_current_min_no_of_poles_TU_20_deg_C: 76 A; Solid_min_H05_07_V_U: 0,5 mm²; Solid_max_H05_07_V_U: 16 mm²; Rated_voltage_use_group_B_UL_1059: 600 V; Rated_current_use_group_B_UL_1059: 51 A; Wire_cross_section_AWG_min_UL_1059: AWG 22; Wire_cross_section_AWG_max_UL_1059: AWG 6; PackageReference: LUP_10_16_90V_04; Colour: Pebble grey; Packaging: Box; Qty: 20 PCS; Revision: V1; ComponentLink1Description: Manufacturer URL; ComponentLink1URL: http://www.weidmueller.com/; ComponentLink2Description: URL Link1; ComponentLink2URL: http://catalog.weidmueller.com/catalog/Start.do?localeId=en&ObjectID=1193080000
footprint LUP_10_16_90V_04 (OMNIMATE Power - Serie LUP  LUP 10.16/04/90V 3.2)
pins: A1, A2, A3, A4
1 alternate drawing of the same symbol

## 1193080000_Single
designator E?
OMNIMATE Power - series LUP; PartNumber: 1193080000; Manufacturer: Weidmueller; Short_text_for_material: LUP 10.16/04/90V 3.2SN GY BX; Side_termination_characteristic: closed side; Mounting_onto_the_PCB: Solder connection; Pitch_mm: 10,16 mm; Pitch_inch: 0,4 inch; No_of_poles: 4; Solder_pin_length_mm: 3,2 mm; Contact_material: E-Cu; Contact_surface: tinned; Insulating_material: Wemid (PA); UL_94_flammability_rating: V-0; Rated_voltage_for_surge_voltage_class_pollution_degree_II_2: 1000 V; Rated_current_min_no_of_poles_TU_20_deg_C: 76 A; Solid_min_H05_07_V_U: 0,5 mm²; Solid_max_H05_07_V_U: 16 mm²; Rated_voltage_use_group_B_UL_1059: 600 V; Rated_current_use_group_B_UL_1059: 51 A; Wire_cross_section_AWG_min_UL_1059: AWG 22; Wire_cross_section_AWG_max_UL_1059: AWG 6; PackageReference: LUP_10_16_90V_04; Colour: Pebble grey; Packaging: Box; Qty: 20 PCS; Revision: V1; ComponentLink1Description: Manufacturer URL; ComponentLink1URL: http://www.weidmueller.com/; ComponentLink2Description: URL Link1; ComponentLink2URL: http://catalog.weidmueller.com/catalog/Start.do?localeId=en&ObjectID=1193080000
footprint LUP_10_16_90V_04 (OMNIMATE Power - Serie LUP  LUP 10.16/04/90V 3.2)
part A pins: A1
part B pins: A2
part C pins: A3
part D pins: A4
1 alternate drawing of the same symbol

## 1193090000
designator E?
OMNIMATE Power - series LUP; PartNumber: 1193090000; Manufacturer: Weidmueller; Short_text_for_material: LUP 10.16/05/90V 3.2SN GY BX; Side_termination_characteristic: closed side; Mounting_onto_the_PCB: Solder connection; Pitch_mm: 10,16 mm; Pitch_inch: 0,4 inch; No_of_poles: 5; Solder_pin_length_mm: 3,2 mm; Contact_material: E-Cu; Contact_surface: tinned; Insulating_material: Wemid (PA); UL_94_flammability_rating: V-0; Rated_voltage_for_surge_voltage_class_pollution_degree_II_2: 1000 V; Rated_current_min_no_of_poles_TU_20_deg_C: 76 A; Solid_min_H05_07_V_U: 0,5 mm²; Solid_max_H05_07_V_U: 16 mm²; Rated_voltage_use_group_B_UL_1059: 600 V; Rated_current_use_group_B_UL_1059: 51 A; Wire_cross_section_AWG_min_UL_1059: AWG 22; Wire_cross_section_AWG_max_UL_1059: AWG 6; PackageReference: LUP_10_16_90V_05; Colour: Pebble grey; Packaging: Box; Qty: 20 PCS; Revision: V1; ComponentLink1Description: Manufacturer URL; ComponentLink1URL: http://www.weidmueller.com/; ComponentLink2Description: URL Link1; ComponentLink2URL: http://catalog.weidmueller.com/catalog/Start.do?localeId=en&ObjectID=1193090000
footprint LUP_10_16_90V_05 (OMNIMATE Power - Serie LUP  LUP 10.16/05/90V 3.2)
pins: A1, A2, A3, A4, A5
1 alternate drawing of the same symbol